# Altium footprint library smd-ipc.PCBLIB: 363 footprints (part 2 of 27) (continued)
## CQFP-100 [mm] (continued)
  rectangle: 12.54,-19 12.86,-16.5
  rectangle: 13.81,-19 14.13,-16.5
  rectangle: 15.08,-19 15.4,-16.5
  rectangle: 16.5,-15.4 19,-15.08
  rectangle: 16.5,-14.13 19,-13.81
  rectangle: 16.5,-12.86 19,-12.54
  rectangle: 16.5,-11.59 19,-11.27
  rectangle: 16.5,-10.32 19,-10
  rectangle: 16.5,-9.05 19,-8.73
  rectangle: 16.5,-7.78 19,-7.46
  rectangle: 16.5,-6.51 19,-6.19
  rectangle: 16.5,-5.24 19,-4.92
  rectangle: 16.5,-3.97 19,-3.65
  rectangle: 16.5,-2.7 19,-2.38
  rectangle: 16.5,-1.43 19,-1.11
  rectangle: 16.5,-0.16 19,0.16
  rectangle: 16.5,1.11 19,1.43
  rectangle: 16.5,2.38 19,2.7
  rectangle: 16.5,3.65 19,3.97
  rectangle: 16.5,4.92 19,5.24
  rectangle: 16.5,6.19 19,6.51
  rectangle: 16.5,7.46 19,7.78
  rectangle: 16.5,8.73 19,9.05
  rectangle: 16.5,10 19,10.32
  rectangle: 16.5,11.27 19,11.59
  rectangle: 16.5,12.54 19,12.86
  rectangle: 16.5,13.81 19,14.13
  rectangle: 16.5,15.08 19,15.4
  rectangle: 15.08,16.5 15.4,19
  rectangle: 13.81,16.5 14.13,19
  rectangle: 12.54,16.5 12.86,19
  rectangle: 11.27,16.5 11.59,19
  rectangle: 10,16.5 10.32,19
  rectangle: 8.73,16.5 9.05,19
  rectangle: 7.46,16.5 7.78,19
  rectangle: 6.19,16.5 6.51,19
  rectangle: 4.92,16.5 5.24,19
  rectangle: 3.65,16.5 3.97,19
  rectangle: 2.38,16.5 2.7,19
  rectangle: 1.11,16.5 1.43,19
  rectangle: -0.16,16.5 0.16,19
  rectangle: -1.43,16.5 -1.11,19
  rectangle: -2.7,16.5 -2.38,19
  rectangle: -3.97,16.5 -3.65,19
  rectangle: -5.24,16.5 -4.92,19
  rectangle: -6.51,16.5 -6.19,19
  rectangle: -7.78,16.5 -7.46,19
  rectangle: -9.05,16.5 -8.73,19
  rectangle: -10.32,16.5 -10,19
  rectangle: -11.59,16.5 -11.27,19
  rectangle: -12.86,16.5 -12.54,19
  rectangle: -14.13,16.5 -13.81,19
  rectangle: -15.4,16.5 -15.08,19
  rectangle: -19,15.08 -16.5,15.4
  rectangle: -19,13.81 -16.5,14.13
  rectangle: -19,12.54 -16.5,12.86
  rectangle: -19,11.27 -16.5,11.59
  rectangle: -19,10 -16.5,10.32
  rectangle: -19,8.73 -16.5,9.05
  rectangle: -19,7.46 -16.5,7.78
  rectangle: -19,6.19 -16.5,6.51
  rectangle: -19,4.92 -16.5,5.24
  rectangle: -19,3.65 -16.5,3.97
  rectangle: -19,2.38 -16.5,2.7
  rectangle: -19,1.11 -16.5,1.43
  rectangle: -19,-0.16 -16.5,0.16
  rectangle: -19,-1.43 -16.5,-1.11
  rectangle: -19,-2.7 -16.5,-2.38
  rectangle: -19,-3.97 -16.5,-3.65
  rectangle: -19,-5.24 -16.5,-4.92
  rectangle: -19,-6.51 -16.5,-6.19
  rectangle: -19,-7.78 -16.5,-7.46
  rectangle: -19,-9.05 -16.5,-8.73
  rectangle: -19,-10.32 -16.5,-10
  rectangle: -19,-11.59 -16.5,-11.27
  rectangle: -19,-12.86 -16.5,-12.54
  rectangle: -19,-14.13 -16.5,-13.81
  rectangle: -19,-15.4 -16.5,-15.08
Mechanical 27:
  lines w0.2: -19.903,-19.903 19.903,-19.903 19.903,19.903 -19.903,19.903 -19.903,-19.903

## CQFP-120 [mm]
pads (120):
  rect 0.5x2.2 smd: 1(-11.6,-15.1) 2(-10.8,-15.1) 3(-10,-15.1) 4(-9.2,-15.1) 5(-8.4,-15.1) 6(-7.6,-15.1) 7(-6.8,-15.1) 8(-6,-15.1) 9(-5.2,-15.1) 10(-4.4,-15.1) 11(-3.6,-15.1) 12(-2.8,-15.1) 13(-2,-15.1) 14(-1.2,-15.1) 15(-0.4,-15.1) 16(0.4,-15.1) 17(1.2,-15.1) 18(2,-15.1) 19(2.8,-15.1) 20(3.6,-15.1) 21(4.4,-15.1) 22(5.2,-15.1) 23(6,-15.1) 24(6.8,-15.1) 25(7.6,-15.1) 26(8.4,-15.1) 27(9.2,-15.1) 28(10,-15.1) 29(10.8,-15.1) 30(11.6,-15.1) 61(11.6,15.1) 62(10.8,15.1) 63(10,15.1) 64(9.2,15.1) 65(8.4,15.1) 66(7.6,15.1) 67(6.8,15.1) 68(6,15.1) 69(5.2,15.1) 70(4.4,15.1) 71(3.6,15.1) 72(2.8,15.1) 73(2,15.1) 74(1.2,15.1) 75(0.4,15.1) 76(-0.4,15.1) 77(-1.2,15.1) 78(-2,15.1) 79(-2.8,15.1) 80(-3.6,15.1) 81(-4.4,15.1) 82(-5.2,15.1) 83(-6,15.1) 84(-6.8,15.1) 85(-7.6,15.1) 86(-8.4,15.1) 87(-9.2,15.1) 88(-10,15.1) 89(-10.8,15.1) 90(-11.6,15.1)
  rect 2.2x0.5 smd: 31(15.1,-11.6) 32(15.1,-10.8) 33(15.1,-10) 34(15.1,-9.2) 35(15.1,-8.4) 36(15.1,-7.6) 37(15.1,-6.8) 38(15.1,-6) 39(15.1,-5.2) 40(15.1,-4.4) 41(15.1,-3.6) 42(15.1,-2.8) 43(15.1,-2) 44(15.1,-1.2) 45(15.1,-0.4) 46(15.1,0.4) 47(15.1,1.2) 48(15.1,2) 49(15.1,2.8) 50(15.1,3.6) 51(15.1,4.4) 52(15.1,5.2) 53(15.1,6) 54(15.1,6.8) 55(15.1,7.6) 56(15.1,8.4) 57(15.1,9.2) 58(15.1,10) 59(15.1,10.8) 60(15.1,11.6) 91(-15.1,11.6) 92(-15.1,10.8) 93(-15.1,10) 94(-15.1,9.2) 95(-15.1,8.4) 96(-15.1,7.6) 97(-15.1,6.8) 98(-15.1,6) 99(-15.1,5.2) 100(-15.1,4.4) 101(-15.1,3.6) 102(-15.1,2.8) 103(-15.1,2) 104(-15.1,1.2) 105(-15.1,0.4) 106(-15.1,-0.4) 107(-15.1,-1.2) 108(-15.1,-2) 109(-15.1,-2.8) 110(-15.1,-3.6) 111(-15.1,-4.4) 112(-15.1,-5.2) 113(-15.1,-6) 114(-15.1,-6.8) 115(-15.1,-7.6) 116(-15.1,-8.4) 117(-15.1,-9.2) 118(-15.1,-10) 119(-15.1,-10.8) 120(-15.1,-11.6)
Top Overlay:
  lines w0.203: -13.3,-11.7 -12,-11.7 -12,-12.4 -13.4,-12.4 ; -13.4,-12.4 -13.4,12.5 -12.5,13.4 12.5,13.4 13.4,12.5 13.4,-12.5 12.5,-13.4 -12.5,-13.4 -13.4,-12.5 -13.4,-12.4
Mechanical 16:
  rectangle: -11.83,-15.89 -11.37,-13.4
  rectangle: -11.03,-15.89 -10.57,-13.4
  rectangle: -10.23,-15.89 -9.77,-13.4
  rectangle: -9.43,-15.89 -8.97,-13.4
  rectangle: -8.63,-15.89 -8.17,-13.4
  rectangle: -7.83,-15.89 -7.37,-13.4
  rectangle: -7.03,-15.89 -6.57,-13.4
  rectangle: -6.23,-15.89 -5.77,-13.4
  rectangle: -5.43,-15.89 -4.97,-13.4
  rectangle: -4.63,-15.89 -4.17,-13.4
  rectangle: -3.83,-15.89 -3.37,-13.4
  rectangle: -3.03,-15.89 -2.57,-13.4
  rectangle: -2.23,-15.89 -1.77,-13.4
  rectangle: -1.43,-15.89 -0.97,-13.4
  rectangle: -0.63,-15.89 -0.17,-13.4
  rectangle: 0.17,-15.89 0.63,-13.4
  rectangle: 0.97,-15.89 1.43,-13.4
  rectangle: 1.77,-15.89 2.23,-13.4
  rectangle: 2.57,-15.89 3.03,-13.4
  rectangle: 3.37,-15.89 3.83,-13.4
  rectangle: 4.17,-15.89 4.63,-13.4
  rectangle: 4.97,-15.89 5.43,-13.4
  rectangle: 5.77,-15.89 6.23,-13.4
  rectangle: 6.57,-15.89 7.03,-13.4
  rectangle: 7.37,-15.89 7.83,-13.4
  rectangle: 8.17,-15.89 8.63,-13.4
  rectangle: 8.97,-15.89 9.43,-13.4
  rectangle: 9.77,-15.89 10.23,-13.4
  rectangle: 10.57,-15.89 11.03,-13.4
  rectangle: 11.37,-15.89 11.83,-13.4
  rectangle: 13.4,-11.83 15.89,-11.37
  rectangle: 13.4,-11.03 15.89,-10.57
  rectangle: 13.4,-10.23 15.89,-9.77
  rectangle: 13.4,-9.43 15.89,-8.97
  rectangle: 13.4,-8.63 15.89,-8.17
  rectangle: 13.4,-7.83 15.89,-7.37
  rectangle: 13.4,-7.03 15.89,-6.57
  rectangle: 13.4,-6.23 15.89,-5.77
  rectangle: 13.4,-5.43 15.89,-4.97
  rectangle: 13.4,-4.63 15.89,-4.17
  rectangle: 13.4,-3.83 15.89,-3.37
  rectangle: 13.4,-3.03 15.89,-2.57
  rectangle: 13.4,-2.23 15.89,-1.77
  rectangle: 13.4,-1.43 15.89,-0.97
  rectangle: 13.4,-0.63 15.89,-0.17
  rectangle: 13.4,0.17 15.89,0.63
  rectangle: 13.4,0.97 15.89,1.43
  rectangle: 13.4,1.77 15.89,2.23
  rectangle: 13.4,2.57 15.89,3.03
  rectangle: 13.4,3.37 15.89,3.83
  rectangle: 13.4,4.17 15.89,4.63
  rectangle: 13.4,4.97 15.89,5.43
  rectangle: 13.4,5.77 15.89,6.23
  rectangle: 13.4,6.57 15.89,7.03
  rectangle: 13.4,7.37 15.89,7.83
  rectangle: 13.4,8.17 15.89,8.63
  rectangle: 13.4,8.97 15.89,9.43
  rectangle: 13.4,9.77 15.89,10.23
  rectangle: 13.4,10.57 15.89,11.03
  rectangle: 13.4,11.37 15.89,11.83
  rectangle: 11.37,13.4 11.83,15.89
  rectangle: 10.57,13.4 11.03,15.89
  rectangle: 9.77,13.4 10.23,15.89
  rectangle: 8.97,13.4 9.43,15.89
  rectangle: 8.17,13.4 8.63,15.89
  rectangle: 7.37,13.4 7.83,15.89
  rectangle: 6.57,13.4 7.03,15.89
  rectangle: 5.77,13.4 6.23,15.89
  rectangle: 4.97,13.4 5.43,15.89
  rectangle: 4.17,13.4 4.63,15.89
  rectangle: 3.37,13.4 3.83,15.89
  rectangle: 2.57,13.4 3.03,15.89
  rectangle: 1.77,13.4 2.23,15.89
  rectangle: 0.97,13.4 1.43,15.89
  rectangle: 0.17,13.4 0.63,15.89
  rectangle: -0.63,13.4 -0.17,15.89
  rectangle: -1.43,13.4 -0.97,15.89
  rectangle: -2.23,13.4 -1.77,15.89
  rectangle: -3.03,13.4 -2.57,15.89
  rectangle: -3.83,13.4 -3.37,15.89
  rectangle: -4.63,13.4 -4.17,15.89
  rectangle: -5.43,13.4 -4.97,15.89
  rectangle: -6.23,13.4 -5.77,15.89
  rectangle: -7.03,13.4 -6.57,15.89
  rectangle: -7.83,13.4 -7.37,15.89
  rectangle: -8.63,13.4 -8.17,15.89
  rectangle: -9.43,13.4 -8.97,15.89
  rectangle: -10.23,13.4 -9.77,15.89
  rectangle: -11.03,13.4 -10.57,15.89
  rectangle: -11.83,13.4 -11.37,15.89
  rectangle: -15.89,11.37 -13.4,11.83
  rectangle: -15.89,10.57 -13.4,11.03
  rectangle: -15.89,9.77 -13.4,10.23
  rectangle: -15.89,8.97 -13.4,9.43
  rectangle: -15.89,8.17 -13.4,8.63
  rectangle: -15.89,7.37 -13.4,7.83
  rectangle: -15.89,6.57 -13.4,7.03
  rectangle: -15.89,5.77 -13.4,6.23
  rectangle: -15.89,4.97 -13.4,5.43
  rectangle: -15.89,4.17 -13.4,4.63
  rectangle: -15.89,3.37 -13.4,3.83
  rectangle: -15.89,2.57 -13.4,3.03
  rectangle: -15.89,1.77 -13.4,2.23
  rectangle: -15.89,0.97 -13.4,1.43
  rectangle: -15.89,0.17 -13.4,0.63
  rectangle: -15.89,-0.63 -13.4,-0.17
  rectangle: -15.89,-1.43 -13.4,-0.97
  rectangle: -15.89,-2.23 -13.4,-1.77
  rectangle: -15.89,-3.03 -13.4,-2.57
  rectangle: -15.89,-3.83 -13.4,-3.37
  rectangle: -15.89,-4.63 -13.4,-4.17
  rectangle: -15.89,-5.43 -13.4,-4.97
  rectangle: -15.89,-6.23 -13.4,-5.77
  rectangle: -15.89,-7.03 -13.4,-6.57
  rectangle: -15.89,-7.83 -13.4,-7.37
  rectangle: -15.89,-8.63 -13.4,-8.17
  rectangle: -15.89,-9.43 -13.4,-8.97
  rectangle: -15.89,-10.23 -13.4,-9.77
  rectangle: -15.89,-11.03 -13.4,-10.57
  rectangle: -15.89,-11.83 -13.4,-11.37
Mechanical 27:
  lines w0.2: -16.903,-16.903 16.903,-16.903 16.903,16.903 -16.903,16.903 -16.903,-16.903

## CQFP-128 [mm]
pads (128):
  rect 0.5x2.2 smd: 1(-12.4,-15.1) 2(-11.6,-15.1) 3(-10.8,-15.1) 4(-10,-15.1) 5(-9.2,-15.1) 6(-8.4,-15.1) 7(-7.6,-15.1) 8(-6.8,-15.1) 9(-6,-15.1) 10(-5.2,-15.1) 11(-4.4,-15.1) 12(-3.6,-15.1) 13(-2.8,-15.1) 14(-2,-15.1) 15(-1.2,-15.1) 16(-0.4,-15.1) 17(0.4,-15.1) 18(1.2,-15.1) 19(2,-15.1) 20(2.8,-15.1) 21(3.6,-15.1) 22(4.4,-15.1) 23(5.2,-15.1) 24(6,-15.1) 25(6.8,-15.1) 26(7.6,-15.1) 27(8.4,-15.1) 28(9.2,-15.1) 29(10,-15.1) 30(10.8,-15.1) 31(11.6,-15.1) 32(12.4,-15.1) 65(12.4,15.1) 66(11.6,15.1) 67(10.8,15.1) 68(10,15.1) 69(9.2,15.1) 70(8.4,15.1) 71(7.6,15.1) 72(6.8,15.1) 73(6,15.1) 74(5.2,15.1) 75(4.4,15.1) 76(3.6,15.1) 77(2.8,15.1) 78(2,15.1) 79(1.2,15.1) 80(0.4,15.1) 81(-0.4,15.1) 82(-1.2,15.1) 83(-2,15.1) 84(-2.8,15.1) 85(-3.6,15.1) 86(-4.4,15.1) 87(-5.2,15.1) 88(-6,15.1) 89(-6.8,15.1) 90(-7.6,15.1) 91(-8.4,15.1) 92(-9.2,15.1) 93(-10,15.1) 94(-10.8,15.1) 95(-11.6,15.1) 96(-12.4,15.1)
  rect 2.2x0.5 smd: 33(15.1,-12.4) 34(15.1,-11.6) 35(15.1,-10.8) 36(15.1,-10) 37(15.1,-9.2) 38(15.1,-8.4) 39(15.1,-7.6) 40(15.1,-6.8) 41(15.1,-6) 42(15.1,-5.2) 43(15.1,-4.4) 44(15.1,-3.6) 45(15.1,-2.8) 46(15.1,-2) 47(15.1,-1.2) 48(15.1,-0.4) 49(15.1,0.4) 50(15.1,1.2) 51(15.1,2) 52(15.1,2.8) 53(15.1,3.6) 54(15.1,4.4) 55(15.1,5.2) 56(15.1,6) 57(15.1,6.8) 58(15.1,7.6) 59(15.1,8.4) 60(15.1,9.2) 61(15.1,10) 62(15.1,10.8) 63(15.1,11.6) 64(15.1,12.4) 97(-15.1,12.4) 98(-15.1,11.6) 99(-15.1,10.8) 100(-15.1,10) 101(-15.1,9.2) 102(-15.1,8.4) 103(-15.1,7.6) 104(-15.1,6.8) 105(-15.1,6) 106(-15.1,5.2) 107(-15.1,4.4) 108(-15.1,3.6) 109(-15.1,2.8) 110(-15.1,2) 111(-15.1,1.2) 112(-15.1,0.4) 113(-15.1,-0.4) 114(-15.1,-1.2) 115(-15.1,-2) 116(-15.1,-2.8) 117(-15.1,-3.6) 118(-15.1,-4.4) 119(-15.1,-5.2) 120(-15.1,-6) 121(-15.1,-6.8) 122(-15.1,-7.6) 123(-15.1,-8.4) 124(-15.1,-9.2) 125(-15.1,-10) 126(-15.1,-10.8) 127(-15.1,-11.6) 128(-15.1,-12.4)
Top Overlay:
  lines w0.152: -13.3,-11.7 -12,-11.7 -12,-12.4 -13.4,-12.4 ; -13.4,-12.4 -13.4,12.5 -12.5,13.4 12.5,13.4 13.4,12.5 13.4,-12.5 12.5,-13.4 -12.5,-13.4 -13.4,-12.5 -13.4,-12.4
Mechanical 16:
  rectangle: -12.63,-15.89 -12.17,-13.4
  rectangle: -11.83,-15.89 -11.37,-13.4
  rectangle: -11.03,-15.89 -10.57,-13.4
  rectangle: -10.23,-15.89 -9.77,-13.4
  rectangle: -9.43,-15.89 -8.97,-13.4
  rectangle: -8.63,-15.89 -8.17,-13.4
  rectangle: -7.83,-15.89 -7.37,-13.4
  rectangle: -7.03,-15.89 -6.57,-13.4
  rectangle: -6.23,-15.89 -5.77,-13.4
  rectangle: -5.43,-15.89 -4.97,-13.4
  rectangle: -4.63,-15.89 -4.17,-13.4
  rectangle: -3.83,-15.89 -3.37,-13.4
  rectangle: -3.03,-15.89 -2.57,-13.4
  rectangle: -2.23,-15.89 -1.77,-13.4
  rectangle: -1.43,-15.89 -0.97,-13.4
  rectangle: -0.63,-15.89 -0.17,-13.4
  rectangle: 0.17,-15.89 0.63,-13.4
  rectangle: 0.97,-15.89 1.43,-13.4
  rectangle: 1.77,-15.89 2.23,-13.4
  rectangle: 2.57,-15.89 3.03,-13.4
  rectangle: 3.37,-15.89 3.83,-13.4
  rectangle: 4.17,-15.89 4.63,-13.4
  rectangle: 4.97,-15.89 5.43,-13.4
  rectangle: 5.77,-15.89 6.23,-13.4
  rectangle: 6.57,-15.89 7.03,-13.4
  rectangle: 7.37,-15.89 7.83,-13.4
  rectangle: 8.17,-15.89 8.63,-13.4
  rectangle: 8.97,-15.89 9.43,-13.4
  rectangle: 9.77,-15.89 10.23,-13.4
  rectangle: 10.57,-15.89 11.03,-13.4
  rectangle: 11.37,-15.89 11.83,-13.4
  rectangle: 12.17,-15.89 12.63,-13.4
  rectangle: 13.4,-12.63 15.89,-12.17
  rectangle: 13.4,-11.83 15.89,-11.37
  rectangle: 13.4,-11.03 15.89,-10.57
  rectangle: 13.4,-10.23 15.89,-9.77
  rectangle: 13.4,-9.43 15.89,-8.97
  rectangle: 13.4,-8.63 15.89,-8.17
  rectangle: 13.4,-7.83 15.89,-7.37
  rectangle: 13.4,-7.03 15.89,-6.57
  rectangle: 13.4,-6.23 15.89,-5.77
  rectangle: 13.4,-5.43 15.89,-4.97
  rectangle: 13.4,-4.63 15.89,-4.17
  rectangle: 13.4,-3.83 15.89,-3.37
  rectangle: 13.4,-3.03 15.89,-2.57
  rectangle: 13.4,-2.23 15.89,-1.77
  rectangle: 13.4,-1.43 15.89,-0.97
  rectangle: 13.4,-0.63 15.89,-0.17
  rectangle: 13.4,0.17 15.89,0.63
  rectangle: 13.4,0.97 15.89,1.43
  rectangle: 13.4,1.77 15.89,2.23
  rectangle: 13.4,2.57 15.89,3.03
  rectangle: 13.4,3.37 15.89,3.83
  rectangle: 13.4,4.17 15.89,4.63
  rectangle: 13.4,4.97 15.89,5.43
  rectangle: 13.4,5.77 15.89,6.23
  rectangle: 13.4,6.57 15.89,7.03
  rectangle: 13.4,7.37 15.89,7.83
  rectangle: 13.4,8.17 15.89,8.63
  rectangle: 13.4,8.97 15.89,9.43
  rectangle: 13.4,9.77 15.89,10.23
  rectangle: 13.4,10.57 15.89,11.03
  rectangle: 13.4,11.37 15.89,11.83
  rectangle: 13.4,12.17 15.89,12.63
  rectangle: 12.17,13.4 12.63,15.89
  rectangle: 11.37,13.4 11.83,15.89
  rectangle: 10.57,13.4 11.03,15.89
  rectangle: 9.77,13.4 10.23,15.89
  rectangle: 8.97,13.4 9.43,15.89
  rectangle: 8.17,13.4 8.63,15.89
  rectangle: 7.37,13.4 7.83,15.89
  rectangle: 6.57,13.4 7.03,15.89
  rectangle: 5.77,13.4 6.23,15.89
  rectangle: 4.97,13.4 5.43,15.89
  rectangle: 4.17,13.4 4.63,15.89
  rectangle: 3.37,13.4 3.83,15.89
  rectangle: 2.57,13.4 3.03,15.89
  rectangle: 1.77,13.4 2.23,15.89
  rectangle: 0.97,13.4 1.43,15.89
  rectangle: 0.17,13.4 0.63,15.89
  rectangle: -0.63,13.4 -0.17,15.89
  rectangle: -1.43,13.4 -0.97,15.89
  rectangle: -2.23,13.4 -1.77,15.89
  rectangle: -3.03,13.4 -2.57,15.89
  rectangle: -3.83,13.4 -3.37,15.89
  rectangle: -4.63,13.4 -4.17,15.89
  rectangle: -5.43,13.4 -4.97,15.89
  rectangle: -6.23,13.4 -5.77,15.89
  rectangle: -7.03,13.4 -6.57,15.89
  rectangle: -7.83,13.4 -7.37,15.89
  rectangle: -8.63,13.4 -8.17,15.89
  rectangle: -9.43,13.4 -8.97,15.89
  rectangle: -10.23,13.4 -9.77,15.89
  rectangle: -11.03,13.4 -10.57,15.89
  rectangle: -11.83,13.4 -11.37,15.89
  rectangle: -12.63,13.4 -12.17,15.89
  rectangle: -15.89,12.17 -13.4,12.63
  rectangle: -15.89,11.37 -13.4,11.83
  rectangle: -15.89,10.57 -13.4,11.03
  rectangle: -15.89,9.77 -13.4,10.23
  rectangle: -15.89,8.97 -13.4,9.43
  rectangle: -15.89,8.17 -13.4,8.63
  rectangle: -15.89,7.37 -13.4,7.83
  rectangle: -15.89,6.57 -13.4,7.03
  rectangle: -15.89,5.77 -13.4,6.23
  rectangle: -15.89,4.97 -13.4,5.43
  rectangle: -15.89,4.17 -13.4,4.63
  rectangle: -15.89,3.37 -13.4,3.83
  rectangle: -15.89,2.57 -13.4,3.03
  rectangle: -15.89,1.77 -13.4,2.23
  rectangle: -15.89,0.97 -13.4,1.43
  rectangle: -15.89,0.17 -13.4,0.63
  rectangle: -15.89,-0.63 -13.4,-0.17
  rectangle: -15.89,-1.43 -13.4,-0.97
  rectangle: -15.89,-2.23 -13.4,-1.77
  rectangle: -15.89,-3.03 -13.4,-2.57
  rectangle: -15.89,-3.83 -13.4,-3.37
  rectangle: -15.89,-4.63 -13.4,-4.17
  rectangle: -15.89,-5.43 -13.4,-4.97
  rectangle: -15.89,-6.23 -13.4,-5.77
  rectangle: -15.89,-7.03 -13.4,-6.57
  rectangle: -15.89,-7.83 -13.4,-7.37
  rectangle: -15.89,-8.63 -13.4,-8.17
  rectangle: -15.89,-9.43 -13.4,-8.97
  rectangle: -15.89,-10.23 -13.4,-9.77
  rectangle: -15.89,-11.03 -13.4,-10.57
  rectangle: -15.89,-11.83 -13.4,-11.37
  rectangle: -15.89,-12.63 -13.4,-12.17
Mechanical 27:
  lines w0.2: -16.903,-16.903 16.903,-16.903 16.903,16.903 -16.903,16.903 -16.903,-16.903

## CQFP-132 [mm]
pads (132):
  rect 0.4x2.2 smd: 1(-10.175,-13.2) 2(-9.54,-13.2) 3(-8.905,-13.2) 4(-8.27,-13.2) 5(-7.635,-13.2) 6(-7,-13.2) 7(-6.365,-13.2) 8(-5.73,-13.2) 9(-5.095,-13.2) 10(-4.46,-13.2) 11(-3.825,-13.2) 12(-3.19,-13.2) 13(-2.555,-13.2) 14(-1.92,-13.2) 15(-1.285,-13.2) 16(-0.65,-13.2) 17(-0.015,-13.2) 18(0.62,-13.2) 19(1.255,-13.2) 20(1.89,-13.2) 21(2.525,-13.2) 22(3.16,-13.2) 23(3.795,-13.2) 24(4.43,-13.2) 25(5.065,-13.2) 26(5.7,-13.2) 27(6.335,-13.2) 28(6.97,-13.2) 29(7.605,-13.2) 30(8.24,-13.2) 31(8.875,-13.2) 32(9.51,-13.2) 33(10.145,-13.2) 67(10.175,13.2) 68(9.54,13.2) 69(8.905,13.2) 70(8.27,13.2) 71(7.635,13.2) 72(7,13.2) 73(6.365,13.2) 74(5.73,13.2) 75(5.095,13.2) 76(4.46,13.2) 77(3.825,13.2) 78(3.19,13.2) 79(2.555,13.2) 80(1.92,13.2) 81(1.285,13.2) 82(0.65,13.2) 83(0.015,13.2) 84(-0.62,13.2) 85(-1.255,13.2) 86(-1.89,13.2) 87(-2.525,13.2) 88(-3.16,13.2) 89(-3.795,13.2) 90(-4.43,13.2) 91(-5.065,13.2) 92(-5.7,13.2) 93(-6.335,13.2) 94(-6.97,13.2) 95(-7.605,13.2) 96(-8.24,13.2) 97(-8.875,13.2) 98(-9.51,13.2) 99(-10.145,13.2)
  rect 2.2x0.4 smd: 34(13.2,-10.175) 35(13.2,-9.54) 36(13.2,-8.905) 37(13.2,-8.27) 38(13.2,-7.635) 39(13.2,-7) 40(13.2,-6.365) 41(13.2,-5.73) 42(13.2,-5.095) 43(13.2,-4.46) 44(13.2,-3.825) 45(13.2,-3.19) 46(13.2,-2.555) 47(13.2,-1.92) 48(13.2,-1.285) 49(13.2,-0.65) 50(13.2,-0.015) 51(13.2,0.62) 52(13.2,1.255) 53(13.2,1.89) 54(13.2,2.525) 55(13.2,3.16) 56(13.2,3.795) 57(13.2,4.43) 58(13.2,5.065) 59(13.2,5.7) 60(13.2,6.335) 61(13.2,6.97) 62(13.2,7.605) 63(13.2,8.24) 64(13.2,8.875) 65(13.2,9.51) 66(13.2,10.145) 100(-13.2,10.175) 101(-13.2,9.54) 102(-13.2,8.905) 103(-13.2,8.27) 104(-13.2,7.635) 105(-13.2,7) 106(-13.2,6.365) 107(-13.2,5.73) 108(-13.2,5.095) 109(-13.2,4.46) 110(-13.2,3.825) 111(-13.2,3.19) 112(-13.2,2.555) 113(-13.2,1.92) 114(-13.2,1.285) 115(-13.2,0.65) 116(-13.2,0.015) 117(-13.2,-0.62) 118(-13.2,-1.255) 119(-13.2,-1.89) 120(-13.2,-2.525) 121(-13.2,-3.16) 122(-13.2,-3.795) 123(-13.2,-4.43) 124(-13.2,-5.065) 125(-13.2,-5.7) 126(-13.2,-6.335) 127(-13.2,-6.97) 128(-13.2,-7.605) 129(-13.2,-8.24) 130(-13.2,-8.875) 131(-13.2,-9.51) 132(-13.2,-10.145)
Top Overlay:
  lines w0.203: -11.3,-9.7 -10,-9.7 -10,-10.4 -11.4,-10.4 ; -11.4,-10.4 -11.4,10.5 -10.5,11.4 10.5,11.4 11.4,10.5 11.4,-10.5 10.5,-11.4 -10.5,-11.4 -11.4,-10.5 -11.4,-10.4
Mechanical 16:
  rectangle: -10.365,-14 -9.985,-11.5
  rectangle: -9.73,-14 -9.35,-11.5
  rectangle: -9.095,-14 -8.715,-11.5
  rectangle: -8.46,-14 -8.08,-11.5
  rectangle: -7.825,-14 -7.445,-11.5
  rectangle: -7.19,-14 -6.81,-11.5
  rectangle: -6.555,-14 -6.175,-11.5
  rectangle: -5.92,-14 -5.54,-11.5
  rectangle: -5.285,-14 -4.905,-11.5
  rectangle: -4.65,-14 -4.27,-11.5
  rectangle: -4.015,-14 -3.635,-11.5
  rectangle: -3.38,-14 -3,-11.5
  rectangle: -2.745,-14 -2.365,-11.5
  rectangle: -2.11,-14 -1.73,-11.5
  rectangle: -1.475,-14 -1.095,-11.5
  rectangle: -0.84,-14 -0.46,-11.5
  rectangle: -0.205,-14 0.175,-11.5
  rectangle: 0.43,-14 0.81,-11.5
  rectangle: 1.065,-14 1.445,-11.5
  rectangle: 1.7,-14 2.08,-11.5
  rectangle: 2.335,-14 2.715,-11.5
  rectangle: 2.97,-14 3.35,-11.5
  rectangle: 3.605,-14 3.985,-11.5
  rectangle: 4.24,-14 4.62,-11.5
  rectangle: 4.875,-14 5.255,-11.5
  rectangle: 5.51,-14 5.89,-11.5
  rectangle: 6.145,-14 6.525,-11.5
  rectangle: 6.78,-14 7.16,-11.5
  rectangle: 7.415,-14 7.795,-11.5
  rectangle: 8.05,-14 8.43,-11.5
  rectangle: 8.685,-14 9.065,-11.5
  rectangle: 9.32,-14 9.7,-11.5
  rectangle: 9.955,-14 10.335,-11.5
  rectangle: 11.5,-10.365 14,-9.985
  rectangle: 11.5,-9.73 14,-9.35
  rectangle: 11.5,-9.095 14,-8.715
  rectangle: 11.5,-8.46 14,-8.08
  rectangle: 11.5,-7.825 14,-7.445
  rectangle: 11.5,-7.19 14,-6.81
  rectangle: 11.5,-6.555 14,-6.175
  rectangle: 11.5,-5.92 14,-5.54
  rectangle: 11.5,-5.285 14,-4.905
  rectangle: 11.5,-4.65 14,-4.27
  rectangle: 11.5,-4.015 14,-3.635
  rectangle: 11.5,-3.38 14,-3
  rectangle: 11.5,-2.745 14,-2.365
  rectangle: 11.5,-2.11 14,-1.73
  rectangle: 11.5,-1.475 14,-1.095
  rectangle: 11.5,-0.84 14,-0.46
  rectangle: 11.5,-0.205 14,0.175
  rectangle: 11.5,0.43 14,0.81
  rectangle: 11.5,1.065 14,1.445
  rectangle: 11.5,1.7 14,2.08
  rectangle: 11.5,2.335 14,2.715
  rectangle: 11.5,2.97 14,3.35
  rectangle: 11.5,3.605 14,3.985
  rectangle: 11.5,4.24 14,4.62
  rectangle: 11.5,4.875 14,5.255
  rectangle: 11.5,5.51 14,5.89
  rectangle: 11.5,6.145 14,6.525
  rectangle: 11.5,6.78 14,7.16
  rectangle: 11.5,7.415 14,7.795
  rectangle: 11.5,8.05 14,8.43
  rectangle: 11.5,8.685 14,9.065
  rectangle: 11.5,9.32 14,9.7
  rectangle: 11.5,9.955 14,10.335
  rectangle: 9.985,11.5 10.365,14
  rectangle: 9.35,11.5 9.73,14
  rectangle: 8.715,11.5 9.095,14
  rectangle: 8.08,11.5 8.46,14
  rectangle: 7.445,11.5 7.825,14
  rectangle: 6.81,11.5 7.19,14
  rectangle: 6.175,11.5 6.555,14
  rectangle: 5.54,11.5 5.92,14
  rectangle: 4.905,11.5 5.285,14
  rectangle: 4.27,11.5 4.65,14
  rectangle: 3.635,11.5 4.015,14
  rectangle: 3,11.5 3.38,14
  rectangle: 2.365,11.5 2.745,14
  rectangle: 1.73,11.5 2.11,14
  rectangle: 1.095,11.5 1.475,14
  rectangle: 0.46,11.5 0.84,14
  rectangle: -0.175,11.5 0.205,14
  rectangle: -0.81,11.5 -0.43,14
  rectangle: -1.445,11.5 -1.065,14
  rectangle: -2.08,11.5 -1.7,14
  rectangle: -2.715,11.5 -2.335,14
  rectangle: -3.35,11.5 -2.97,14
  rectangle: -3.985,11.5 -3.605,14
  rectangle: -4.62,11.5 -4.24,14
  rectangle: -5.255,11.5 -4.875,14
  rectangle: -5.89,11.5 -5.51,14
  rectangle: -6.525,11.5 -6.145,14
  rectangle: -7.16,11.5 -6.78,14
  rectangle: -7.795,11.5 -7.415,14
  rectangle: -8.43,11.5 -8.05,14
  rectangle: -9.065,11.5 -8.685,14
  rectangle: -9.7,11.5 -9.32,14
  rectangle: -10.335,11.5 -9.955,14
  rectangle: -14,9.985 -11.5,10.365
  rectangle: -14,9.35 -11.5,9.73
  rectangle: -14,8.715 -11.5,9.095
  rectangle: -14,8.08 -11.5,8.46
  rectangle: -14,7.445 -11.5,7.825
  rectangle: -14,6.81 -11.5,7.19
  rectangle: -14,6.175 -11.5,6.555
  rectangle: -14,5.54 -11.5,5.92
  rectangle: -14,4.905 -11.5,5.285
  rectangle: -14,4.27 -11.5,4.65
  rectangle: -14,3.635 -11.5,4.015
  rectangle: -14,3 -11.5,3.38
  rectangle: -14,2.365 -11.5,2.745
  rectangle: -14,1.73 -11.5,2.11
  rectangle: -14,1.095 -11.5,1.475
  rectangle: -14,0.46 -11.5,0.84
  rectangle: -14,-0.175 -11.5,0.205
  rectangle: -14,-0.81 -11.5,-0.43
  rectangle: -14,-1.445 -11.5,-1.065
  rectangle: -14,-2.08 -11.5,-1.7
  rectangle: -14,-2.715 -11.5,-2.335
  rectangle: -14,-3.35 -11.5,-2.97
  rectangle: -14,-3.985 -11.5,-3.605
  rectangle: -14,-4.62 -11.5,-4.24
  rectangle: -14,-5.255 -11.5,-4.875
  rectangle: -14,-5.89 -11.5,-5.51
  rectangle: -14,-6.525 -11.5,-6.145
  rectangle: -14,-7.16 -11.5,-6.78
  rectangle: -14,-7.795 -11.5,-7.415
  rectangle: -14,-8.43 -11.5,-8.05
  rectangle: -14,-9.065 -11.5,-8.685
  rectangle: -14,-9.7 -11.5,-9.32
  rectangle: -14,-10.335 -11.5,-9.955
Mechanical 27:
  lines w0.2: -14.903,-14.903 14.903,-14.903 14.903,14.903 -14.903,14.903 -14.903,-14.903